# Altium footprint library Package_SO.PcbLib: 333 footprints (part 11 of 21)
Each footprint in its own frame and in the unit in brackets; x right, y up, seen from the top. Pads: shape width x height; smd on the part's side, far side on the other; paste and mask are expansions set on the pad; w line width, h text height; cw(c..) or ccw(c..) is an arc to the next point about the centre after c.
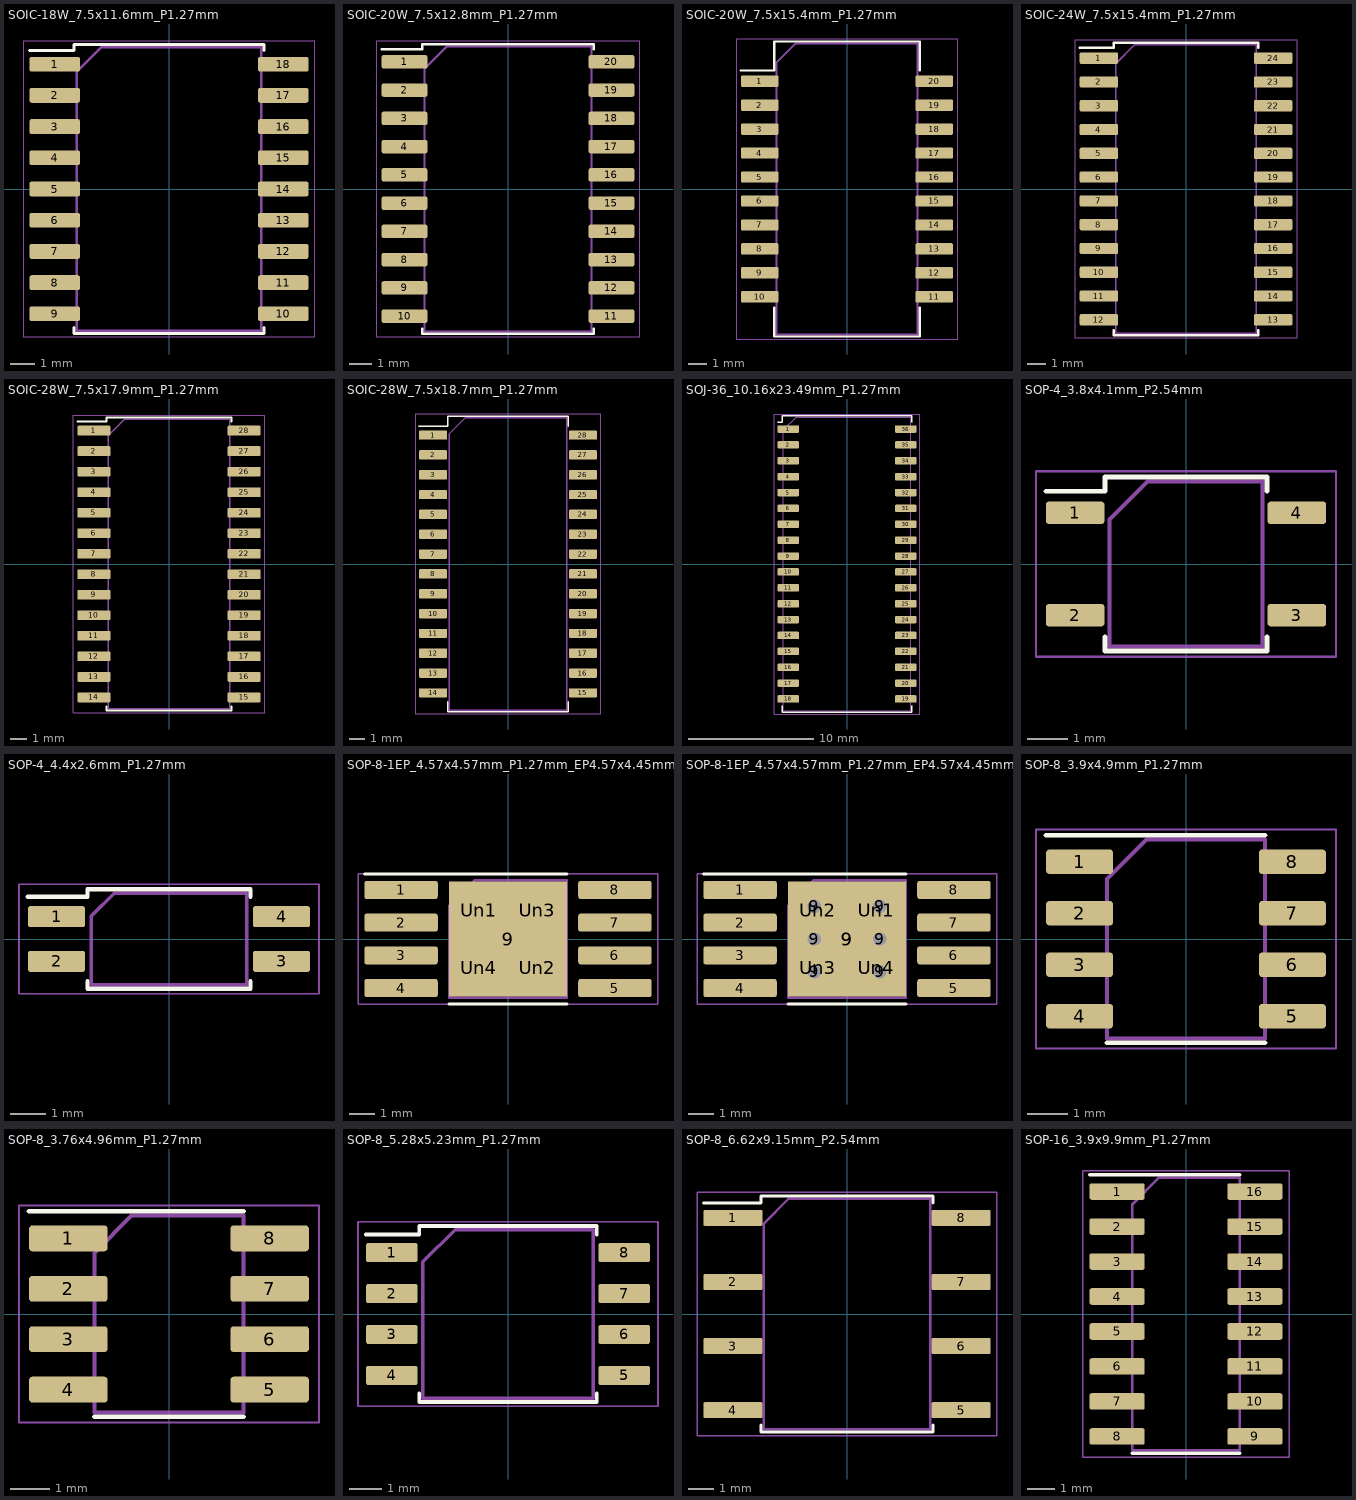
[diagram p10: the footprints below, top view; thin cyan lines are the x and y axes]

## SOIC-18W_7.5x11.6mm_P1.27mm [mm]
pads (18):
  rrect25% 2.05x0.6 smd: 1(-4.65,5.08) 2(-4.65,3.81) 3(-4.65,2.54) 4(-4.65,1.27) 5(-4.65,0) 6(-4.65,-1.27) 7(-4.65,-2.54) 8(-4.65,-3.81) 9(-4.65,-5.08) 10(4.65,-5.08) 11(4.65,-3.81) 12(4.65,-2.54) 13(4.65,-1.27) 14(4.65,0) 15(4.65,1.27) 16(4.65,2.54) 17(4.65,3.81) 18(4.65,5.08)
F.SilkS:
  lines w0.12: -5.675,5.64 -3.86,5.64 -3.86,5.885 0,5.885 3.86,5.885 3.86,5.64 ; -3.86,-5.64 -3.86,-5.885 0,-5.885 3.86,-5.885 3.86,-5.64
F.CrtYd:
  lines w0.05: -5.93,-6.02 5.93,-6.02 5.93,6.02 -5.93,6.02 -5.93,-6.02
F.Fab:
  lines w0.1: -3.75,-5.775 3.75,-5.775 3.75,5.775 -2.75,5.775 -3.75,4.775 -3.75,-5.775
  text "'.Designator'" at -4.047,-0.84 h1

## SOIC-20W_7.5x12.8mm_P1.27mm [mm]
pads (20):
  rrect25% 2.05x0.6 smd: 1(-4.65,5.715) 2(-4.65,4.445) 3(-4.65,3.175) 4(-4.65,1.905) 5(-4.65,0.635) 6(-4.65,-0.635) 7(-4.65,-1.905) 8(-4.65,-3.175) 9(-4.65,-4.445) 10(-4.65,-5.715) 11(4.65,-5.715) 12(4.65,-4.445) 13(4.65,-3.175) 14(4.65,-1.905) 15(4.65,-0.635) 16(4.65,0.635) 17(4.65,1.905) 18(4.65,3.175) 19(4.65,4.445) 20(4.65,5.715)
F.SilkS:
  lines w0.12: -5.675,6.275 -3.86,6.275 -3.86,6.51 0,6.51 3.86,6.51 3.86,6.275 ; -3.86,-6.275 -3.86,-6.51 0,-6.51 3.86,-6.51 3.86,-6.275
F.CrtYd:
  lines w0.05: -5.93,-6.65 -5.93,6.65 5.93,6.65 5.93,-6.65 -5.93,-6.65
F.Fab:
  lines w0.1: -3.75,-6.4 -3.75,5.4 -2.75,6.4 3.75,6.4 3.75,-6.4 -3.75,-6.4
  text "'.Designator'" at -4.047,-0.84 h1

## SOIC-20W_7.5x15.4mm_P1.27mm [mm]
pads (20):
  rrect25% 2x0.6 smd: 1(-4.625,5.715) 2(-4.625,4.445) 3(-4.625,3.175) 4(-4.625,1.905) 5(-4.625,0.635) 6(-4.625,-0.635) 7(-4.625,-1.905) 8(-4.625,-3.175) 9(-4.625,-4.445) 10(-4.625,-5.715) 11(4.625,-5.715) 12(4.625,-4.445) 13(4.625,-3.175) 14(4.625,-1.905) 15(4.625,-0.635) 16(4.625,0.635) 17(4.625,1.905) 18(4.625,3.175) 19(4.625,4.445) 20(4.625,5.715)
F.SilkS:
  lines w0.12: -5.625,6.275 -3.855,6.275 -3.855,7.812 0,7.812 3.855,7.812 3.855,6.275 ; -3.855,-6.275 -3.855,-7.812 0,-7.812 3.855,-7.812 3.855,-6.275
F.CrtYd:
  lines w0.05: -5.88,-7.95 -5.88,7.95 5.88,7.95 5.88,-7.95 -5.88,-7.95
F.Fab:
  lines w0.1: -3.745,-7.702 3.745,-7.702 3.745,7.702 -2.745,7.702 -3.745,6.703 -3.745,-7.702
  text "'.Designator'" at -4.047,-0.84 h1

## SOIC-24W_7.5x15.4mm_P1.27mm [mm]
pads (24):
  rrect25% 2.05x0.6 smd: 1(-4.65,6.985) 2(-4.65,5.715) 3(-4.65,4.445) 4(-4.65,3.175) 5(-4.65,1.905) 6(-4.65,0.635) 7(-4.65,-0.635) 8(-4.65,-1.905) 9(-4.65,-3.175) 10(-4.65,-4.445) 11(-4.65,-5.715) 12(-4.65,-6.985) 13(4.65,-6.985) 14(4.65,-5.715) 15(4.65,-4.445) 16(4.65,-3.175) 17(4.65,-1.905) 18(4.65,-0.635) 19(4.65,0.635) 20(4.65,1.905) 21(4.65,3.175) 22(4.65,4.445) 23(4.65,5.715) 24(4.65,6.985)
F.SilkS:
  lines w0.12: -5.675,7.545 -3.86,7.545 -3.86,7.81 0,7.81 3.86,7.81 3.86,7.545 ; -3.86,-7.545 -3.86,-7.81 0,-7.81 3.86,-7.81 3.86,-7.545
F.CrtYd:
  lines w0.05: -5.93,-7.95 5.93,-7.95 5.93,7.95 -5.93,7.95 -5.93,-7.95
F.Fab:
  lines w0.1: -3.75,-7.7 -3.75,6.7 -2.75,7.7 3.75,7.7 3.75,-7.7 -3.75,-7.7
  text "'.Designator'" at -4.047,-0.84 h1

## SOIC-28W_7.5x17.9mm_P1.27mm [mm]
pads (28):
  rrect25% 2.05x0.6 smd: 1(-4.65,8.255) 2(-4.65,6.985) 3(-4.65,5.715) 4(-4.65,4.445) 5(-4.65,3.175) 6(-4.65,1.905) 7(-4.65,0.635) 8(-4.65,-0.635) 9(-4.65,-1.905) 10(-4.65,-3.175) 11(-4.65,-4.445) 12(-4.65,-5.715) 13(-4.65,-6.985) 14(-4.65,-8.255) 15(4.65,-8.255) 16(4.65,-6.985) 17(4.65,-5.715) 18(4.65,-4.445) 19(4.65,-3.175) 20(4.65,-1.905) 21(4.65,-0.635) 22(4.65,0.635) 23(4.65,1.905) 24(4.65,3.175) 25(4.65,4.445) 26(4.65,5.715) 27(4.65,6.985) 28(4.65,8.255)
F.SilkS:
  lines w0.12: -5.675,8.815 -3.86,8.815 -3.86,9.06 0,9.06 3.86,9.06 3.86,8.815 ; -3.86,-8.815 -3.86,-9.06 0,-9.06 3.86,-9.06 3.86,-8.815
F.CrtYd:
  lines w0.05: -5.93,-9.2 5.93,-9.2 5.93,9.2 -5.93,9.2 -5.93,-9.2
F.Fab:
  lines w0.1: -3.75,-8.95 3.75,-8.95 3.75,8.95 -2.75,8.95 -3.75,7.95 -3.75,-8.95
  text "'.Designator'" at -4.047,-0.84 h1

## SOIC-28W_7.5x18.7mm_P1.27mm [mm]
pads (28):
  rrect25% 1.8x0.6 smd: 1(-4.8,8.255) 2(-4.8,6.985) 3(-4.8,5.715) 4(-4.8,4.445) 5(-4.8,3.175) 6(-4.8,1.905) 7(-4.8,0.635) 8(-4.8,-0.635) 9(-4.8,-1.905) 10(-4.8,-3.175) 11(-4.8,-4.445) 12(-4.8,-5.715) 13(-4.8,-6.985) 14(-4.8,-8.255) 15(4.8,-8.255) 16(4.8,-6.985) 17(4.8,-5.715) 18(4.8,-4.445) 19(4.8,-3.175) 20(4.8,-1.905) 21(4.8,-0.635) 22(4.8,0.635) 23(4.8,1.905) 24(4.8,3.175) 25(4.8,4.445) 26(4.8,5.715) 27(4.8,6.985) 28(4.8,8.255)
F.SilkS:
  lines w0.12: -5.7,8.815 -3.86,8.815 -3.86,9.46 0,9.46 3.86,9.46 3.86,8.815 ; -3.86,-8.815 -3.86,-9.46 0,-9.46 3.86,-9.46 3.86,-8.815
F.CrtYd:
  lines w0.05: -5.95,-9.6 5.95,-9.6 5.95,9.6 -5.95,9.6 -5.95,-9.6
F.Fab:
  lines w0.1: -3.75,-9.35 3.75,-9.35 3.75,9.35 -2.75,9.35 -3.75,8.35 -3.75,-9.35
  text "'.Designator'" at -4.047,-0.84 h1

## SOJ-36_10.16x23.49mm_P1.27mm [mm]
pads (36):
  rrect25% 1.7x0.6 smd: 1(-4.7,10.795) 2(-4.7,9.525) 3(-4.7,8.255) 4(-4.7,6.985) 5(-4.7,5.715) 6(-4.7,4.445) 7(-4.7,3.175) 8(-4.7,1.905) 9(-4.7,0.635) 10(-4.7,-0.635) 11(-4.7,-1.905) 12(-4.7,-3.175) 13(-4.7,-4.445) 14(-4.7,-5.715) 15(-4.7,-6.985) 16(-4.7,-8.255) 17(-4.7,-9.525) 18(-4.7,-10.795) 19(4.7,-10.795) 20(4.7,-9.525) 21(4.7,-8.255) 22(4.7,-6.985) 23(4.7,-5.715) 24(4.7,-4.445) 25(4.7,-3.175) 26(4.7,-1.905) 27(4.7,-0.635) 28(4.7,0.635) 29(4.7,1.905) 30(4.7,3.175) 31(4.7,4.445) 32(4.7,5.715) 33(4.7,6.985) 34(4.7,8.255) 35(4.7,9.525) 36(4.7,10.795)
F.SilkS:
  lines w0.12: -5.55,11.355 -5.19,11.355 -5.19,11.855 0,11.855 5.19,11.855 5.19,11.355 ; -5.19,-11.355 -5.19,-11.855 0,-11.855 5.19,-11.855 5.19,-11.355
F.CrtYd:
  lines w0.05: -5.8,-12 5.8,-12 5.8,12 -5.8,12 -5.8,-12
F.Fab:
  lines w0.1: -5.08,-11.745 5.08,-11.745 5.08,11.745 -4.08,11.745 -5.08,10.745 -5.08,-11.745
  text "'.Designator'" at -4.047,-0.84 h1

## SOP-4_3.8x4.1mm_P2.54mm [mm]
pads (4):
  rrect25% 1.45x0.55 smd: 1(-2.75,1.27) 2(-2.75,-1.27) 3(2.75,-1.27) 4(2.75,1.27)
F.SilkS:
  lines w0.12: -3.475,1.805 -2.01,1.805 -2.01,2.16 0,2.16 2.01,2.16 2.01,1.805 ; -2.01,-1.805 -2.01,-2.16 0,-2.16 2.01,-2.16 2.01,-1.805
F.CrtYd:
  lines w0.05: -3.72,-2.3 3.72,-2.3 3.72,2.3 -3.72,2.3 -3.72,-2.3
F.Fab:
  lines w0.1: -1.9,-2.05 1.9,-2.05 1.9,2.05 -0.95,2.05 -1.9,1.1 -1.9,-2.05
  text "'.Designator'" at -3.702,-0.339 h0.95
3D body "SOP-4_3.8x4.1mm_P2.54mm.step": height 2.1, standoff 0, extent -3.048,-2.044 3.048,2.044

## SOP-4_4.4x2.6mm_P1.27mm [mm]
pads (4):
  rrect25% 1.625x0.6 smd: 1(-3.187,0.635) 2(-3.187,-0.635) 3(3.187,-0.635) 4(3.187,0.635)
F.SilkS:
  lines w0.12: -4,1.195 -2.31,1.195 -2.31,1.41 0,1.41 2.31,1.41 2.31,1.195 ; -2.31,-1.195 -2.31,-1.41 0,-1.41 2.31,-1.41 2.31,-1.195
F.CrtYd:
  lines w0.05: -4.25,-1.55 -4.25,1.55 4.25,1.55 4.25,-1.55 -4.25,-1.55
F.Fab:
  lines w0.1: -2.2,-1.3 -2.2,0.65 -1.55,1.3 2.2,1.3 2.2,-1.3 -2.2,-1.3
  text "'.Designator'" at -3.897,-0.357 h1

## SOP-8-1EP_4.57x4.57mm_P1.27mm_EP4.57x4.45mm [mm]
pads (13):
  rrect25% 2.85x0.7 smd: 1(-4.15,1.905) 2(-4.15,0.635) 3(-4.15,-0.635) 4(-4.15,-1.905) 5(4.15,-1.905) 6(4.15,-0.635) 7(4.15,0.635) 8(4.15,1.905)
  rect 4.57x4.45 smd: 9(0,0)
  rrect14% 1.84x1.79 on Top Paste: Un1(-1.14,1.11) Un2(1.14,-1.11) Un3(1.14,1.11) Un4(-1.14,-1.11)
F.SilkS:
  lines w0.12: -5.575,2.515 0,2.515 2.285,2.515 ; -2.285,-2.515 0,-2.515 2.285,-2.515
F.CrtYd:
  lines w0.05: -5.82,-2.54 5.82,-2.54 5.82,2.54 -5.82,2.54 -5.82,-2.54
F.Fab:
  lines w0.1: -2.285,-2.285 2.285,-2.285 2.285,2.285 -1.285,2.285 -2.285,1.285 -2.285,-2.285
  text "'.Designator'" at -3.897,-0.357 h1

## SOP-8-1EP_4.57x4.57mm_P1.27mm_EP4.57x4.45mm_ThermalVias [mm]
pads (20):
  rrect25% 2.85x0.7 smd: 1(-4.15,1.905) 2(-4.15,0.635) 3(-4.15,-0.635) 4(-4.15,-1.905) 5(4.15,-1.905) 6(4.15,-0.635) 7(4.15,0.635) 8(4.15,1.905)
  round 0.81 hole 0.51: 9(-1.27,-1.27) 9(-1.27,0) 9(-1.27,1.27) 9(1.27,-1.27) 9(1.27,0) 9(1.27,1.27)
  rect 4.57x4.45 smd: 9(0,0)
  rect 3.35x3.35 smd far side: 9(0,0)
  rrect13% 1.91x1.86 on Top Paste: Un1(1.14,1.11) Un2(-1.14,1.11) Un3(-1.14,-1.11) Un4(1.14,-1.11)
F.SilkS:
  lines w0.12: -5.575,2.515 0,2.515 2.285,2.515 ; -2.285,-2.515 0,-2.515 2.285,-2.515
F.CrtYd:
  lines w0.05: -5.82,-2.54 5.82,-2.54 5.82,2.54 -5.82,2.54 -5.82,-2.54
F.Fab:
  lines w0.1: -2.285,-2.285 -2.285,1.285 -1.285,2.285 2.285,2.285 2.285,-2.285 -2.285,-2.285
  text "'.Designator'" at -3.897,-0.357 h1

## SOP-8_3.9x4.9mm_P1.27mm [mm]
pads (8):
  rrect25% 1.65x0.6 smd: 1(-2.625,1.905) 2(-2.625,0.635) 3(-2.625,-0.635) 4(-2.625,-1.905) 5(2.625,-1.905) 6(2.625,-0.635) 7(2.625,0.635) 8(2.625,1.905)
F.SilkS:
  lines w0.12: -3.45,2.56 0,2.56 1.95,2.56 ; -1.95,-2.56 0,-2.56 1.95,-2.56
F.CrtYd:
  lines w0.05: -3.7,-2.7 -3.7,2.7 3.7,2.7 3.7,-2.7 -3.7,-2.7
F.Fab:
  lines w0.1: -1.95,-2.45 -1.95,1.475 -0.975,2.45 1.95,2.45 1.95,-2.45 -1.95,-2.45
  text "'.Designator'" at -3.819,-0.35 h0.98

## SOP-8_3.76x4.96mm_P1.27mm [mm]
pads (8):
  rrect25% 1.975x0.65 smd: 1(-2.538,1.905) 2(-2.538,0.635) 3(-2.538,-0.635) 4(-2.538,-1.905) 5(2.538,-1.905) 6(2.538,-0.635) 7(2.538,0.635) 8(2.538,1.905)
F.SilkS:
  lines w0.12: -3.525,2.59 0,2.59 1.88,2.59 ; -1.88,-2.59 0,-2.59 1.88,-2.59
F.CrtYd:
  lines w0.05: -3.78,-2.73 -3.78,2.73 3.78,2.73 3.78,-2.73 -3.78,-2.73
F.Fab:
  lines w0.1: -1.88,-2.48 1.88,-2.48 1.88,2.48 -0.94,2.48 -1.88,1.54 -1.88,-2.48
  text "'.Designator'" at -3.663,-0.336 h0.94

## SOP-8_5.28x5.23mm_P1.27mm [mm]
pads (8):
  rrect25% 1.6x0.6 smd: 1(-3.6,1.905) 2(-3.6,0.635) 3(-3.6,-0.635) 4(-3.6,-1.905) 5(3.6,-1.905) 6(3.6,-0.635) 7(3.6,0.635) 8(3.6,1.905)
F.SilkS:
  lines w0.12: -4.4,2.465 -2.75,2.465 -2.75,2.725 0,2.725 2.75,2.725 2.75,2.465 ; -2.75,-2.465 -2.75,-2.725 0,-2.725 2.75,-2.725 2.75,-2.465
F.CrtYd:
  lines w0.05: -4.65,-2.86 -4.65,2.86 4.65,2.86 4.65,-2.86 -4.65,-2.86
F.Fab:
  lines w0.1: -2.64,-2.615 -2.64,1.615 -1.64,2.615 2.64,2.615 2.64,-2.615 -2.64,-2.615
  text "'.Designator'" at -3.897,-0.357 h1

## SOP-8_6.62x9.15mm_P2.54mm [mm]
pads (8):
  rrect25% 2.35x0.65 smd: 1(-4.525,3.81) 2(-4.525,1.27) 3(-4.525,-1.27) 4(-4.525,-3.81) 5(4.525,-3.81) 6(4.525,-1.27) 7(4.525,1.27) 8(4.525,3.81)
F.SilkS:
  lines w0.12: -5.7,4.395 -3.42,4.395 -3.42,4.685 0,4.685 3.42,4.685 3.42,4.395 ; -3.42,-4.395 -3.42,-4.685 0,-4.685 3.42,-4.685 3.42,-4.395
F.CrtYd:
  lines w0.05: -5.95,-4.82 5.95,-4.82 5.95,4.82 -5.95,4.82 -5.95,-4.82
F.Fab:
  lines w0.1: -3.31,-4.575 -3.31,3.575 -2.31,4.575 3.31,4.575 3.31,-4.575 -3.31,-4.575
  text "'.Designator'" at -3.897,-0.357 h1

## SOP-16_3.9x9.9mm_P1.27mm [mm]
pads (16):
  rrect25% 2x0.6 smd: 1(-2.5,4.445) 2(-2.5,3.175) 3(-2.5,1.905) 4(-2.5,0.635) 5(-2.5,-0.635) 6(-2.5,-1.905) 7(-2.5,-3.175) 8(-2.5,-4.445) 9(2.5,-4.445) 10(2.5,-3.175) 11(2.5,-1.905) 12(2.5,-0.635) 13(2.5,0.635) 14(2.5,1.905) 15(2.5,3.175) 16(2.5,4.445)
F.SilkS:
  lines w0.12: -3.5,5.06 0,5.06 1.95,5.06 ; -1.95,-5.06 0,-5.06 1.95,-5.06
F.CrtYd:
  lines w0.05: -3.75,-5.2 3.75,-5.2 3.75,5.2 -3.75,5.2 -3.75,-5.2
F.Fab:
  lines w0.1: -1.95,-4.95 -1.95,3.975 -0.975,4.95 1.95,4.95 1.95,-4.95 -1.95,-4.95
  text "'.Designator'" at -3.819,-0.35 h0.98